# Altium footprint library Item_pcb.PcbLib: 282 footprints (part 7 of 18)
Each footprint in its own frame and in the unit in brackets; x right, y up, seen from the top. Pads: shape width x height; smd on the part's side, far side on the other; paste and mask are expansions set on the pad; w line width, h text height; cw(c..) or ccw(c..) is an arc to the next point about the centre after c.
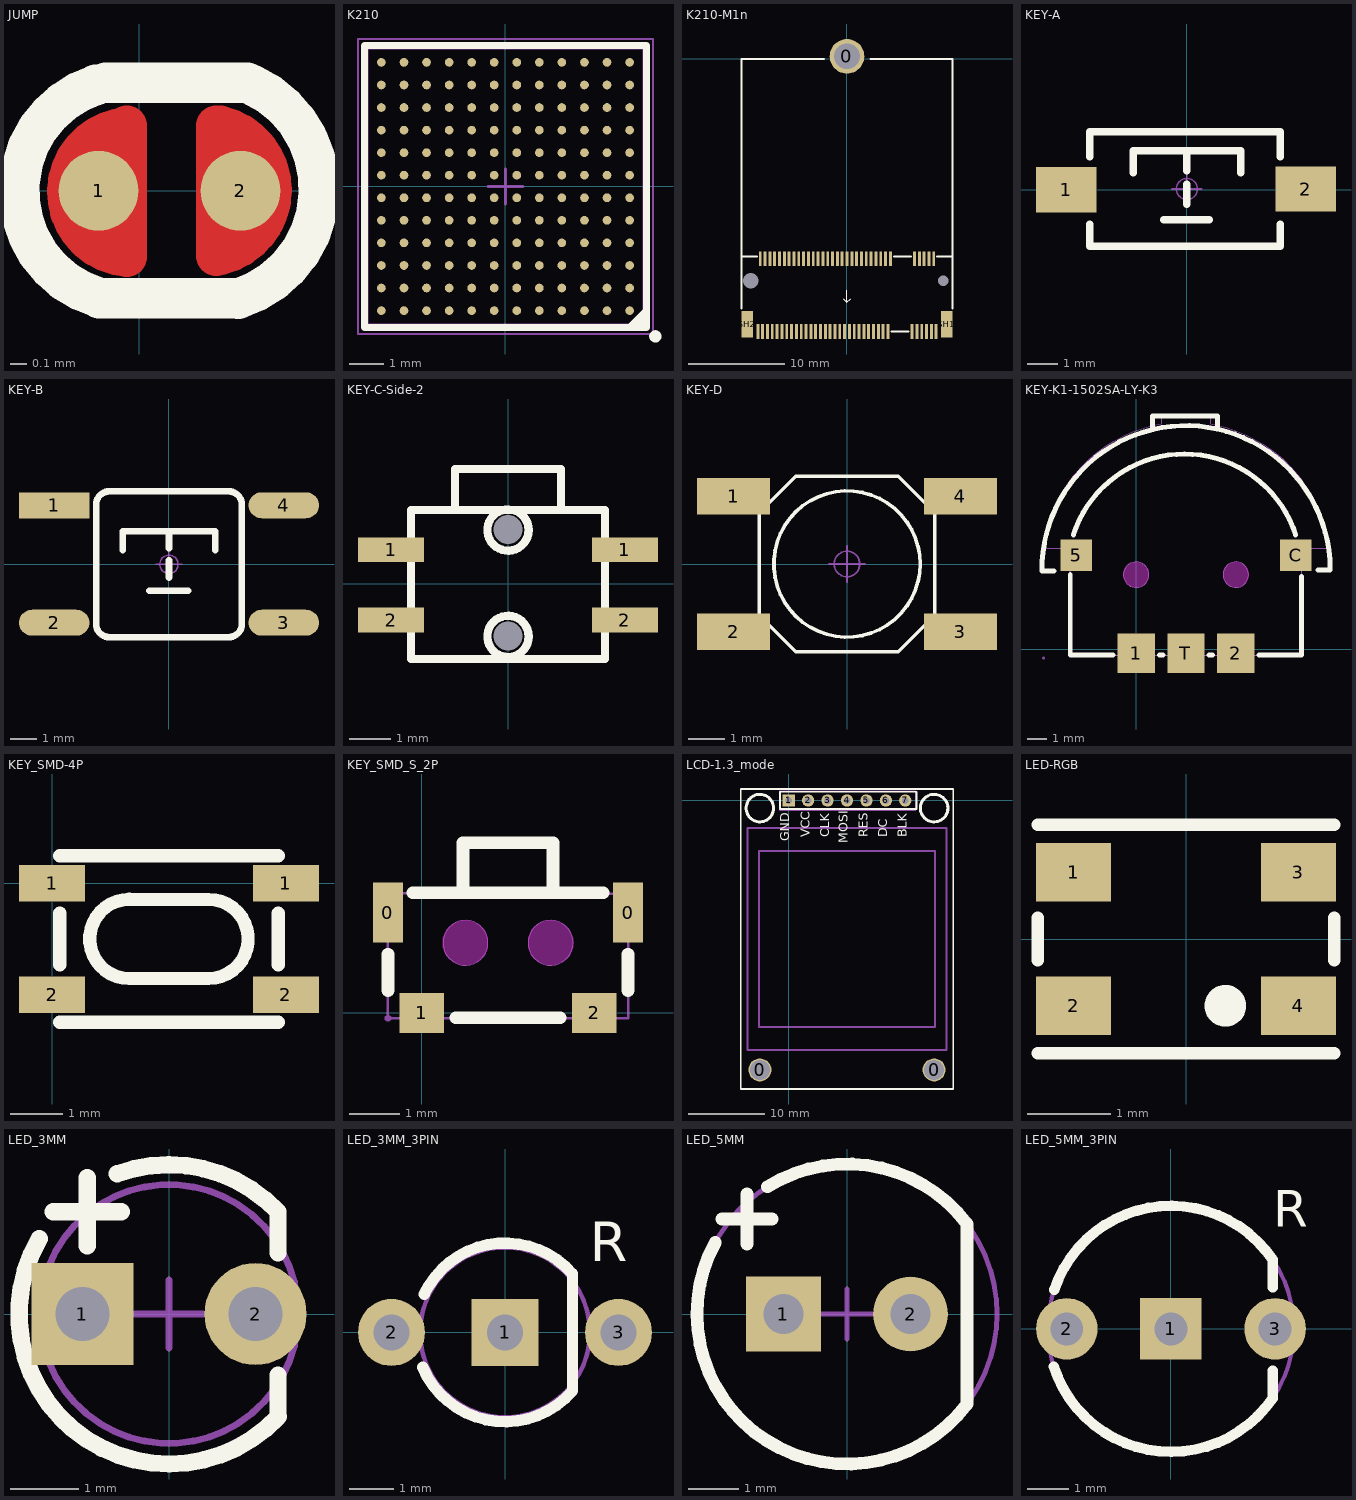
[diagram p6: the footprints below, top view; thin cyan lines are the x and y axes]

## JUMP [mm]
pads (2):
  round 0.5 smd: 1(-0.254,0) 2(0.635,0)
Top Layer:
  lines w0.254: -0.129,0.39 ccw(c-0.043,-0.007) -0.077,-0.412 -0.076,0.406 ; 0.483,-0.406 0.483,0.406 ; 0.508,0.406 cw(c0.417,0.003) 0.51,-0.399
Top Overlay:
  lines w0.254: -0.272,0.663 ccw(c-0.054,-0.001) -0.259,-0.668 ; -0.249,-0.673 0.615,-0.673 ; -0.208,0.678 0.678,0.678 ; 0.62,-0.676 ccw(c0.409,0.011) 0.706,0.665
Top Solder:
  lines w1.143: -0.076,0 0.483,0

## K210 [mm]
pads (144):
  round 0.25 smd mask+0.051: A1(3.575,-3.575) A2(2.925,-3.575) A3(2.275,-3.575) A4(1.625,-3.575) A5(0.975,-3.575) A6(0.325,-3.575) A7(-0.325,-3.575) A8(-0.975,-3.575) A9(-1.625,-3.575) A10(-2.275,-3.575) A11(-2.925,-3.575) A12(-3.575,-3.575) B1(3.575,-2.925) B2(2.925,-2.925) B3(2.275,-2.925) B4(1.625,-2.925) B5(0.975,-2.925) B6(0.325,-2.925) B7(-0.325,-2.925) B8(-0.975,-2.925) B9(-1.625,-2.925) B10(-2.275,-2.925) B11(-2.925,-2.925) B12(-3.575,-2.925) C1(3.575,-2.275) C2(2.925,-2.275) C3(2.275,-2.275) C4(1.625,-2.275) C5(0.975,-2.275) C6(0.325,-2.275) C7(-0.325,-2.275) C8(-0.975,-2.275) C9(-1.625,-2.275) C10(-2.275,-2.275) C11(-2.925,-2.275) C12(-3.575,-2.275) D1(3.575,-1.625) D2(2.925,-1.625) D3(2.275,-1.625) D4(1.625,-1.625) D5(0.975,-1.625) D6(0.325,-1.625) D7(-0.325,-1.625) D8(-0.975,-1.625) D9(-1.625,-1.625) D10(-2.275,-1.625) D11(-2.925,-1.625) D12(-3.575,-1.625) E1(3.575,-0.975) E2(2.925,-0.975) E3(2.275,-0.975) E4(1.625,-0.975) E5(0.975,-0.975) E6(0.325,-0.975) E7(-0.325,-0.975) E8(-0.975,-0.975) E9(-1.625,-0.975) E10(-2.275,-0.975) E11(-2.925,-0.975) E12(-3.575,-0.975) F1(3.575,-0.325) F2(2.925,-0.325) F3(2.275,-0.325) F4(1.625,-0.325) F5(0.975,-0.325) F6(0.325,-0.325) F7(-0.325,-0.325) F8(-0.975,-0.325) F9(-1.625,-0.325) F10(-2.275,-0.325) F11(-2.925,-0.325) F12(-3.575,-0.325) G1(3.575,0.325) G2(2.925,0.325) G3(2.275,0.325) G4(1.625,0.325) G5(0.975,0.325) G6(0.325,0.325) G7(-0.325,0.325) G8(-0.975,0.325) G9(-1.625,0.325) G10(-2.275,0.325) G11(-2.925,0.325) G12(-3.575,0.325) H1(3.575,0.975) H2(2.925,0.975) H3(2.275,0.975) H4(1.625,0.975) H5(0.975,0.975) H6(0.325,0.975) H7(-0.325,0.975) H8(-0.975,0.975) H9(-1.625,0.975) H10(-2.275,0.975) H11(-2.925,0.975) H12(-3.575,0.975) J1(3.575,1.625) J2(2.925,1.625) J3(2.275,1.625) J4(1.625,1.625) J5(0.975,1.625) J6(0.325,1.625) J7(-0.325,1.625) J8(-0.975,1.625) J9(-1.625,1.625) J10(-2.275,1.625) J11(-2.925,1.625) J12(-3.575,1.625) K1(3.575,2.275) K2(2.925,2.275) K3(2.275,2.275) K4(1.625,2.275) K5(0.975,2.275) K6(0.325,2.275) K7(-0.325,2.275) K8(-0.975,2.275) K9(-1.625,2.275) K10(-2.275,2.275) K11(-2.925,2.275) K12(-3.575,2.275) L1(3.575,2.925) L2(2.925,2.925) L3(2.275,2.925) L4(1.625,2.925) L5(0.975,2.925) L6(0.325,2.925) L7(-0.325,2.925) L8(-0.975,2.925) L9(-1.625,2.925) L10(-2.275,2.925) L11(-2.925,2.925) L12(-3.575,2.925) M1(3.575,3.575) M2(2.925,3.575) M3(2.275,3.575) M4(1.625,3.575) M5(0.975,3.575) M6(0.325,3.575) M7(-0.325,3.575) M8(-0.975,3.575) M9(-1.625,3.575) M10(-2.275,3.575) M11(-2.925,3.575) M12(-3.575,3.575)
Top Overlay:
  circle w0.2: c4.318,-4.318 r0.076
  region: 4.064,-4.064 3.429,-4.064 4.064,-3.429
  lines w0.2: -4.064,-4.064 -4.064,4.064 4.064,4.064 4.064,-4.064 -4.064,-4.064
Mechanical 13:
  lines w0.1: -4,-4 -4,4 4,4 4,-4 -4,-4
Mechanical 15:
  lines w0.05: -4.25,-4.25 4.25,-4.25 4.25,4.25 -4.25,4.25 -4.25,-4.25
  lines w0.1: -0.5,0 0.5,0 ; 0,-0.5 0,0.5
3D body "BGA144C65P12X12_800X800X95.step": height 0.95, standoff 0.01, extent -4,-4 4,4

## K210-M1n [mm]
pads (72):
  round 3.6 hole 2.65 mask+0.051: 0(0,0.254)
  rect 0.3x1.55 smd: 1(9.25,-28.287) 2(9,-20.737) 3(8.75,-28.287) 4(8.5,-20.737) 5(8.25,-28.287) 6(8,-20.737) 7(7.75,-28.287) 8(7.5,-20.737) 9(7.25,-28.287) 10(7,-20.737) 11(6.75,-28.287) 20(4.5,-20.737) 21(4.25,-28.287) 22(4,-20.737) 23(3.75,-28.287) 24(3.5,-20.737) 25(3.25,-28.287) 26(3,-20.737) 27(2.75,-28.287) 28(2.5,-20.737) 29(2.25,-28.287) 30(2,-20.737) 31(1.75,-28.287) 32(1.5,-20.737) 33(1.25,-28.287) 34(1,-20.737) 35(0.75,-28.287) 36(0.5,-20.737) 37(0.25,-28.287) 38(0,-20.737) 39(-0.25,-28.287) 40(-0.5,-20.737) 41(-0.75,-28.287) 42(-1,-20.737) 43(-1.25,-28.287) 44(-1.5,-20.737) 45(-1.75,-28.287) 46(-2,-20.737) 47(-2.25,-28.287) 48(-2.5,-20.737) 49(-2.75,-28.287) 50(-3,-20.737) 51(-3.25,-28.287) 52(-3.5,-20.737) 53(-3.75,-28.287) 54(-4,-20.737) 55(-4.25,-28.287) 56(-4.5,-20.737) 57(-4.75,-28.287) 58(-5,-20.737) 59(-5.25,-28.287) 60(-5.5,-20.737) 61(-5.75,-28.287) 62(-6,-20.737) 63(-6.25,-28.287) 64(-6.5,-20.737) 65(-6.75,-28.287) 66(-7,-20.737) 67(-7.25,-28.287) 68(-7.5,-20.737) 69(-7.75,-28.287) 70(-8,-20.737) 71(-8.25,-28.287) 72(-8.5,-20.737) 73(-8.75,-28.287) 74(-9,-20.737) 75(-9.25,-28.287)
  round 0 / inner round 1.524 / far side round 1.6 hole 1.6: " "(-10,-23.012)
  round 0 / inner round 1.524 / far side round 1.1 hole 1.1: " "(10,-23.012)
  rect 1.2x2.75 smd: SH1(10.35,-27.512) SH2(-10.35,-27.512)
Top Overlay:
  lines w0.125: -0.375,-24.887 0,-25.262 ; 0,-24.012 0,-25.262 ; 0.375,-24.887 0,-25.262
  lines w0.2: -10.95,-25.912 -10.95,-20.512 -9.35,-20.512 ; -10.95,-20.512 -10.95,0 -2.388,0 ; 2.413,0 10.95,0 10.95,-20.512 ; 4.6,-28.262 6.4,-28.262 ; 4.85,-20.512 6.65,-20.512 ; 9.35,-20.512 10.95,-20.512 ; 10.95,-25.912 10.95,-20.512
3D body "2377473_2199230-3.stp": height 4.09, standoff -0.61, extent -10.95,-28.862 10.95,-20.162
3D body "K210-NGFF-2663.step": height 5.5, standoff 2.21, extent -11.034,-24.865 10.947,0.125

## KEY-A [mm]
pads (2):
  rect 2x1.5 smd: 1(-3.996,0.005) 2(3.937,0.025)
Top Overlay:
  lines w0.254: -3.212,-1.143 -3.212,-1.875 3.088,-1.875 3.088,-1.143 ; -3.212,1.092 -3.212,1.925 3.088,1.925 3.088,1.092 ; -1.778,0.559 -1.778,1.295 1.778,1.295 1.778,0.559 ; -0.762,-0.991 0.737,-0.991 ; 0,-0.483 0,0.178 ; 0,0.635 0,1.295
Mechanical 15:
  circle w0.05: c0,0.025 r0.35
  lines w0.05: -0.5,0.025 0.5,0.025 ; 0,-0.475 0,0.525
3D body "TSW SMD-3x6x2.5.STEP": height 2.59, standoff -0.03, extent -4,-1.851 4,1.648

## KEY-B [mm]
pads (4):
  rect 2.7x1 smd: 1(-4.4,2.261)
  oval 2.7x1 smd: 2(-4.4,-2.239) 3(4.4,-2.239) 4(4.4,2.261)
Top Overlay:
  lines w0.254: -1.778,0.533 -1.778,1.27 1.778,1.27 1.778,0.533 ; -0.762,-1.016 0.737,-1.016 ; 0,-0.508 0,0.152 ; 0,0.61 0,1.27 ; -2.794,-2.286 ccw(c-2.286,-2.286) -2.286,-2.794 2.286,-2.794 ccw(c2.286,-2.286) 2.794,-2.286 2.794,2.286 ccw(c2.286,2.286) 2.286,2.794 -2.286,2.794 ccw(c-2.286,2.286) -2.794,2.286 -2.794,-2.286
Mechanical 15:
  circle w0.05: c0,0 r0.35
  lines w0.05: -0.5,0 0.5,0 ; 0,-0.5 0,0.5
3D body "TSW SMD-6x6x5.STEP": height 4.95, standoff -0.03, extent -4.5,-3 4.5,3

## KEY-C-Side-2 [mm]
pads (6):
  round 0 hole 0.7: 0(0,-1.26) 0(0,1.314)
  rect 1.6x0.6 smd: 1(-2.832,0.826) 1(2.832,0.826) 2(-2.832,-0.876) 2(2.832,-0.876)
Top Overlay:
  circle w0.2: c0,-1.27 r0.5
  circle w0.2: c0,1.304 r0.5
  lines w0.2: -1.283,1.811 -1.283,2.781 1.283,2.781 1.283,1.811 ; -2.349,-1.816 2.349,-1.816 2.349,1.791 -2.349,1.791 -2.349,-1.816
3D body "零": height 1.63, standoff -0.02, extent -2.959,-1.719 2.941,2.781

## KEY-D [mm] "4*4mm"
pads (4):
  rect 2x1 smd: 1(-3.1,1.85) 2(-3.1,-1.85) 3(3.1,-1.85) 4(3.1,1.85)
Top Overlay:
  circle w0.1: c0,0 r2
  lines w0.1: -2.4,-1.4 -1.4,-2.4 1.4,-2.4 2.4,-1.4 2.4,1.4 1.4,2.4 -1.4,2.4 -2.4,1.4 -2.4,-1.4 ; 0,-2.4 0,-2.4 ; 0,2.4 0,2.4
Mechanical 15:
  circle w0.05: c0,0 r0.35
  lines w0.05: -0.5,0 0.5,0 ; 0,-0.5 0,0.5
3D body "4x4x1.8.STEP": height 1.8, standoff -0.05, extent -3.2,-2.6 3.2,2.6

## KEY-K1-1502SA-LY-K3 [mm]
pads (5):
  rect 1.9x2 smd mask+0.051: 1(0,-0.2) 2(5.08,-0.2) T(2.54,-0.2)
  rect 1.6x1.6 smd mask+0.051: 5(-3.06,4.801) C(8.14,4.801)
Top Overlay:
  lines w0.254: -4.19,3.999 -4.81,4 cw(c2.54,4.05) 9.89,4.1 ; -3.36,3.8 -3.36,-0.3 -1.181,-0.3 ; -3.205,5.828 cw(c2.463,4) 8.131,5.828 ; 0.841,11.201 0.841,11.9 4.14,11.9 4.14,11.25 ; 1.181,-0.3 1.359,-0.3 ; 3.721,-0.3 3.899,-0.3 ; 6.261,-0.3 8.44,-0.3 8.44,3.701 ; 9.271,4.051 9.891,4.049
Keep-Out Layer:
  board cut-out: 5.73,3.8 5.73,3.885 5.686,4.051 5.6,4.199 5.479,4.32 5.331,4.406 5.166,4.45 4.994,4.45 4.829,4.406 4.681,4.32 4.56,4.199 4.474,4.051 4.43,3.885 4.43,3.8 4.43,3.714 4.474,3.549 4.56,3.401 4.681,3.28 4.829,3.194 4.994,3.15 5.166,3.15 5.331,3.194 5.479,3.28 5.6,3.401 5.686,3.549 5.73,3.714
  board cut-out: 0.65,3.8 0.65,3.885 0.606,4.051 0.52,4.199 0.399,4.32 0.251,4.406 0.086,4.45 -0.086,4.45 -0.251,4.406 -0.399,4.32 -0.52,4.199 -0.606,4.051 -0.65,3.885 -0.65,3.8 -0.65,3.714 -0.606,3.549 -0.52,3.401 -0.399,3.28 -0.251,3.194 -0.086,3.15 0.086,3.15 0.251,3.194 0.399,3.28 0.52,3.401 0.606,3.549 0.65,3.714
Mechanical 1:
  circle w0.005: c5.08,3.8 r0.65
  circle w0.005: c0,3.8 r0.65
Mechanical 15:
  region: 7.539,4.201 7.539,5.4 8.438,5.4 8.438,4.201
  region: -3.358,4.201 -3.358,5.4 -2.459,5.4 -2.459,4.201
  region: -0.749,0.699 0.749,0.699 0.749,-0.45 -0.749,-0.45
  region: 1.791,0.699 3.289,0.699 3.289,-0.45 1.791,-0.45
  region: 4.331,0.699 5.829,0.699 5.829,-0.45 4.331,-0.45
  region: -4.653,-0.45 -4.653,-0.424 -4.689,-0.389 -4.739,-0.389 -4.775,-0.424 -4.775,-0.45 -4.775,-0.475 -4.739,-0.511 -4.689,-0.511 -4.653,-0.475
  lines w0.051: -4.714,5.151 -4.671,5.443 -4.646,5.593 -4.623,5.735 -4.605,5.839 -4.544,6.06 -4.425,6.497 -4.381,6.647 -4.219,7.069 -4.034,7.483 -3.746,8.029 -3.495,8.412 -3.205,8.809 -3.086,8.959 -2.822,9.263 -2.606,9.487 -2.372,9.703 -2.024,10.003 -1.519,10.373 -1.135,10.607 -0.584,10.902 -0.165,11.082 0.429,11.293 0.869,11.412 1.288,11.491 1.285,11.803 1.333,11.874 1.351,11.892 1.369,11.905 1.382,11.91 1.43,11.923 1.491,11.928 1.633,11.941 2.156,11.989 2.672,11.994 2.954,11.989 3.416,11.946 3.655,11.923 3.703,11.91 3.729,11.892 3.746,11.874 3.764,11.849 3.782,11.814 3.787,11.803 3.795,11.796 3.795,11.491 4.227,11.407 4.651,11.285 5.131,11.118 5.636,10.914 6.477,10.457 7.089,10.015 7.46,9.703 7.904,9.263 8.397,8.694 8.738,8.113 8.839,8.004 9.253,7.236 9.459,6.642 9.685,5.85 9.794,5.154 8.451,5.143 8.435,4.051 8.435,3.701 8.435,-0.3 -3.363,-0.3 -3.363,4 -3.371,5.143 -4.714,5.151
3D body "3D_PCB6_2022-03-06.step": height 2.6, standoff -0.4, extent -4.71,-0.394 9.79,12.047

## KEY_SMD-4P [mm] "3*4*2.5MM"
pads (4):
  rect 1.27x0.7 smd: 1(0,0) 1(4.5,0) 2(0,-2.15) 2(4.5,-2.15)
Top Overlay:
  lines w0.254: 0.15,-2.675 4.35,-2.675 ; 0.15,-1.569 0.15,-0.581 ; 0.15,0.525 4.35,0.525 ; 0.151,-0.58 0.15,-0.581 ; 4.35,-1.569 4.35,-0.581 ; 0.15,-0.581 0.15,-0.581 ; 1.487,-1.836 cw(c1.487,-1.074) 1.487,-0.312 3.012,-0.313 cw(c3.012,-1.075) 3.011,-1.836 1.487,-1.836
3D body "3D_PCB4_2022-03-06.step": height 2.51, standoff 0, extent -0.099,-2.675 4.6,0.525

## KEY_SMD_S_2P [mil]
pads (4):
  rect 23.6x47.2 smd mask+2: 0(-26.6,78.8) 0(162.4,78.8)
  rect 35.4x31.5 smd mask+2: 1(0,0) 2(135.8,0)
Top Overlay:
  lines w10: -26.6,17.5 -26.6,46 ; -6.9,94.5 142.7,94.5 ; 26.8,-3.9 109,-3.9 ; 32.5,94.5 32.5,133.9 103.3,133.9 103.3,94.5 ; 162.4,17.5 162.4,46
Keep-Out Layer:
  board cut-out: 83.7,55.1 83.7,51.58 86.39,45.07 91.37,40.09 97.88,37.4 104.92,37.4 111.43,40.09 116.41,45.07 119.1,51.58 119.1,55.1 119.1,58.62 116.41,65.13 111.43,70.11 104.92,72.8 97.88,72.8 91.37,70.11 86.39,65.13 83.7,58.62
  board cut-out: 16.7,55.1 16.7,51.58 19.39,45.07 24.37,40.09 30.88,37.4 37.92,37.4 44.43,40.09 49.41,45.07 52.1,51.58 52.1,55.1 52.1,58.62 49.41,65.13 44.43,70.11 37.92,72.8 30.88,72.8 24.37,70.11 19.39,65.13 16.7,58.62
Mechanical 1:
  circle w0.2: c101.4,55.1 r17.7
  circle w0.2: c34.4,55.1 r17.7
Mechanical 15:
  region: 145.7,11.4 145.7,-4.3 126,-4.3 126,11.4
  region: 9.8,11.4 9.8,-4.3 -9.9,-4.3 -9.9,11.4
  region: 162.4,63 154.5,63 154.5,94.5 162.4,94.5
  region: -18.7,63 -26.6,63 -26.6,94.5 -18.7,94.5
  region: -29,-4.3 -29,-5.29 -27.59,-6.7 -25.61,-6.7 -24.2,-5.29 -24.2,-4.3 -24.2,-3.31 -25.61,-1.9 -27.59,-1.9 -29,-3.31
  lines w2: -26.6,-4.3 162.4,-4.3 162.4,93.7 104.1,93.7 103.7,94.1 103.7,132.7 104.1,133.1 32.5,133.5 32.5,94.1 -26.6,94.1 -26.6,-4.3
3D body "3D_PCB3_2022-03-08.step": height 74.8, standoff -15.76, extent -26.5,-7 162.5,126.88

## LCD-1.3_mode [mm]
pads (9):
  round 3 hole 2.6: 0(-3.77,-35.22) 0(19.01,-35.22)
  rect 1.6x1.6 hole 0.9: 1(0,0)
  round 1.6 hole 0.9: 2(2.54,0) 3(5.08,0) 4(7.62,0) 5(10.16,0) 6(12.7,0) 7(15.24,0)
Top Overlay:
  circle w0.4: c19.01,-1 r1.798
  circle w0.4: c-3.77,-1 r1.798
  lines w0.254: -6.27,-3.61 -6.27,1.5 ; -6.27,1.5 21.51,1.5 21.51,-37.72 -6.27,-37.72 -6.27,1.5 ; -1.143,-1.143 -1.143,1.143 16.7,1.143 16.7,-1.143 -1.143,-1.143
  text "BLK" at 15.85,-4.826 h2.03
  text "DC" at 13.291,-4.826 h2.03
  text "RES" at 10.751,-4.826 h2.03
  text "MOSI" at 8.109,-5.588 h2.03
  text "CLK" at 5.671,-4.824 h2.03
  text "VCC" at 3.131,-4.826 h2.03
  text "GND" at 0.489,-5.332 h2.03
Mechanical 15:
  lines w0.1: -1.18,-1.3 -1.18,1.3 16.62,1.3 16.62,-1.3 -1.18,-1.3
  lines w0.254: -5.38,-32.61 20.62,-32.61 20.62,-3.61 -5.38,-3.61 -5.38,-32.61 ; -3.88,-29.61 19.12,-29.61 19.12,-6.61 -3.88,-6.61 -3.88,-29.61
3D body "M3x8+6.STEP": height -1.95, standoff -15.95, extent -6.468,-37.57 -1.072,-32.87
3D body "M3x8+6.STEP": height -1.95, standoff -15.95, extent 16.312,-37.57 21.708,-32.87
3D body "HEADER 2.54X7.stp": height -1.9, standoff -13.1, extent -1.143,-1.228 16.637,1.27
3D body: height 11, standoff 10.5, extent -5.38,-32.61 20.599,-3.61
3D body: height 10.8, standoff 10, extent -6.27,-37.72 21.51,1.5
3D body "M3x6.STEP": height 17.05, standoff 11.05, extent 16.312,-37.57 21.708,-32.87
3D body "M3x6.STEP": height 17.05, standoff 11.05, extent -6.468,-37.57 -1.072,-32.87
3D body: height 11.3, standoff 11, extent -3.9,-29.642 19.12,-6.61

## LED-RGB [mm]
pads (4):
  rect 0.9x0.7 smd: 1(-1.35,0.8) 2(-1.35,-0.8) 3(1.35,0.8) 4(1.35,-0.8)
Top Overlay:
  circle w0.25: c0.472,-0.802 r0.125
  lines w0.152: -1.778,-1.372 1.778,-1.372 ; -1.778,-0.254 -1.778,0.254 ; -1.778,1.372 1.778,1.372 ; 1.778,-0.254 1.778,0.254
3D body "User Library-LED_ASMT-QTB0-0AA02.STEP": height 1.95, standoff -0.05, extent -1.815,-1.7 1.785,1.7

## LED_3MM [mm]
pads (2):
  rect 1.5x1.5 hole 0.8: 1(-1.27,0)
  round 1.5 hole 0.8: 2(1.27,0)
Top Overlay:
  lines w0.254: -1.906,1.103 ccw(c0,0) 1.607,-1.506 ; -1.7,1.5 -0.7,1.5 ; -1.2,1 -1.2,2 ; -0.758,2.058 cw(c0,0) 1.6,1.5 1.6,0.9 ; 1.6,-1.5 1.6,-0.9
Mechanical 15:
  circle w0.1: c0,0 r1.9
  lines w0.1: -0.5,0 0.5,0 ; 0,-0.5 0,0.5
3D body "LED Red 3mm.STEP": height 5.2, standoff -3, extent -1.942,-1.986 1.542,2

## LED_3MM_3PIN [mm]
pads (3):
  rect 1.5x1.5 hole 0.8: 1(0,0)
  round 1.5 hole 0.8: 2(-2.54,0) 3(2.54,0)
Top Overlay:
  lines w0.254: -1.843,-0.776 ccw(c0,0) 1.511,-1.31 1.511,1.31 ccw(c0,0) -1.81,0.852
  text "R" at 1.9,1.3 h1.52
Mechanical 15:
  circle w0.1: c0,0 r1.9
3D body "LED 3mm 3pin.step": height 7.71, standoff -2.33, extent -2.794,-2.048 2.794,2

## LED_5MM [mm]
pads (2):
  rect 1.5x1.5 hole 0.8: 1(-1.27,0)
  round 1.5 hole 0.8: 2(1.27,0)
Top Overlay:
  lines w0.254: -2.638,1.429 ccw(c0,0) 2.4,-1.8 2.4,1.8 ccw(c0,0) -1.59,2.544 ; -2.5,1.9 -1.5,1.9 ; -2,1.4 -2,2.4
Mechanical 15:
  circle w0.1: c0,0 r3
  lines w0.1: -0.5,0 0.5,0 ; 0,-0.5 0,0.5
3D body "User Library-LED5ON-Red.step": height 8.5, standoff -5, extent -3,-3 2.5,3

## LED_5MM_3PIN [mm]
pads (3):
  rect 1.5x1.5 hole 0.8: 1(0,0)
  round 1.5 hole 0.8: 2(-2.54,0) 3(2.54,0)
Top Overlay:
  lines w0.254: -2.856,-0.918 ccw(c0,0) 2.481,-1.687 2.481,-1.019 ; -2.846,0.949 cw(c0,0) 2.481,1.687 2.481,1.019
  text "R" at 2.5,2.2 h1.52
Mechanical 15:
  circle w0.1: c0,0 r3
3D body "LED 5mm 3 pin.step": height 12.5, standoff -3.5, extent -3.012,-2.9 2.932,2.9